# Altium footprint library TranDangKhoa-LIB.PcbLib: 1435 footprints (part 20 of 90)
Each footprint in its own frame and in the unit in brackets; x right, y up, seen from the top. Pads: shape width x height; smd on the part's side, far side on the other; paste and mask are expansions set on the pad; w line width, h text height; cw(c..) or ccw(c..) is an arc to the next point about the centre after c.
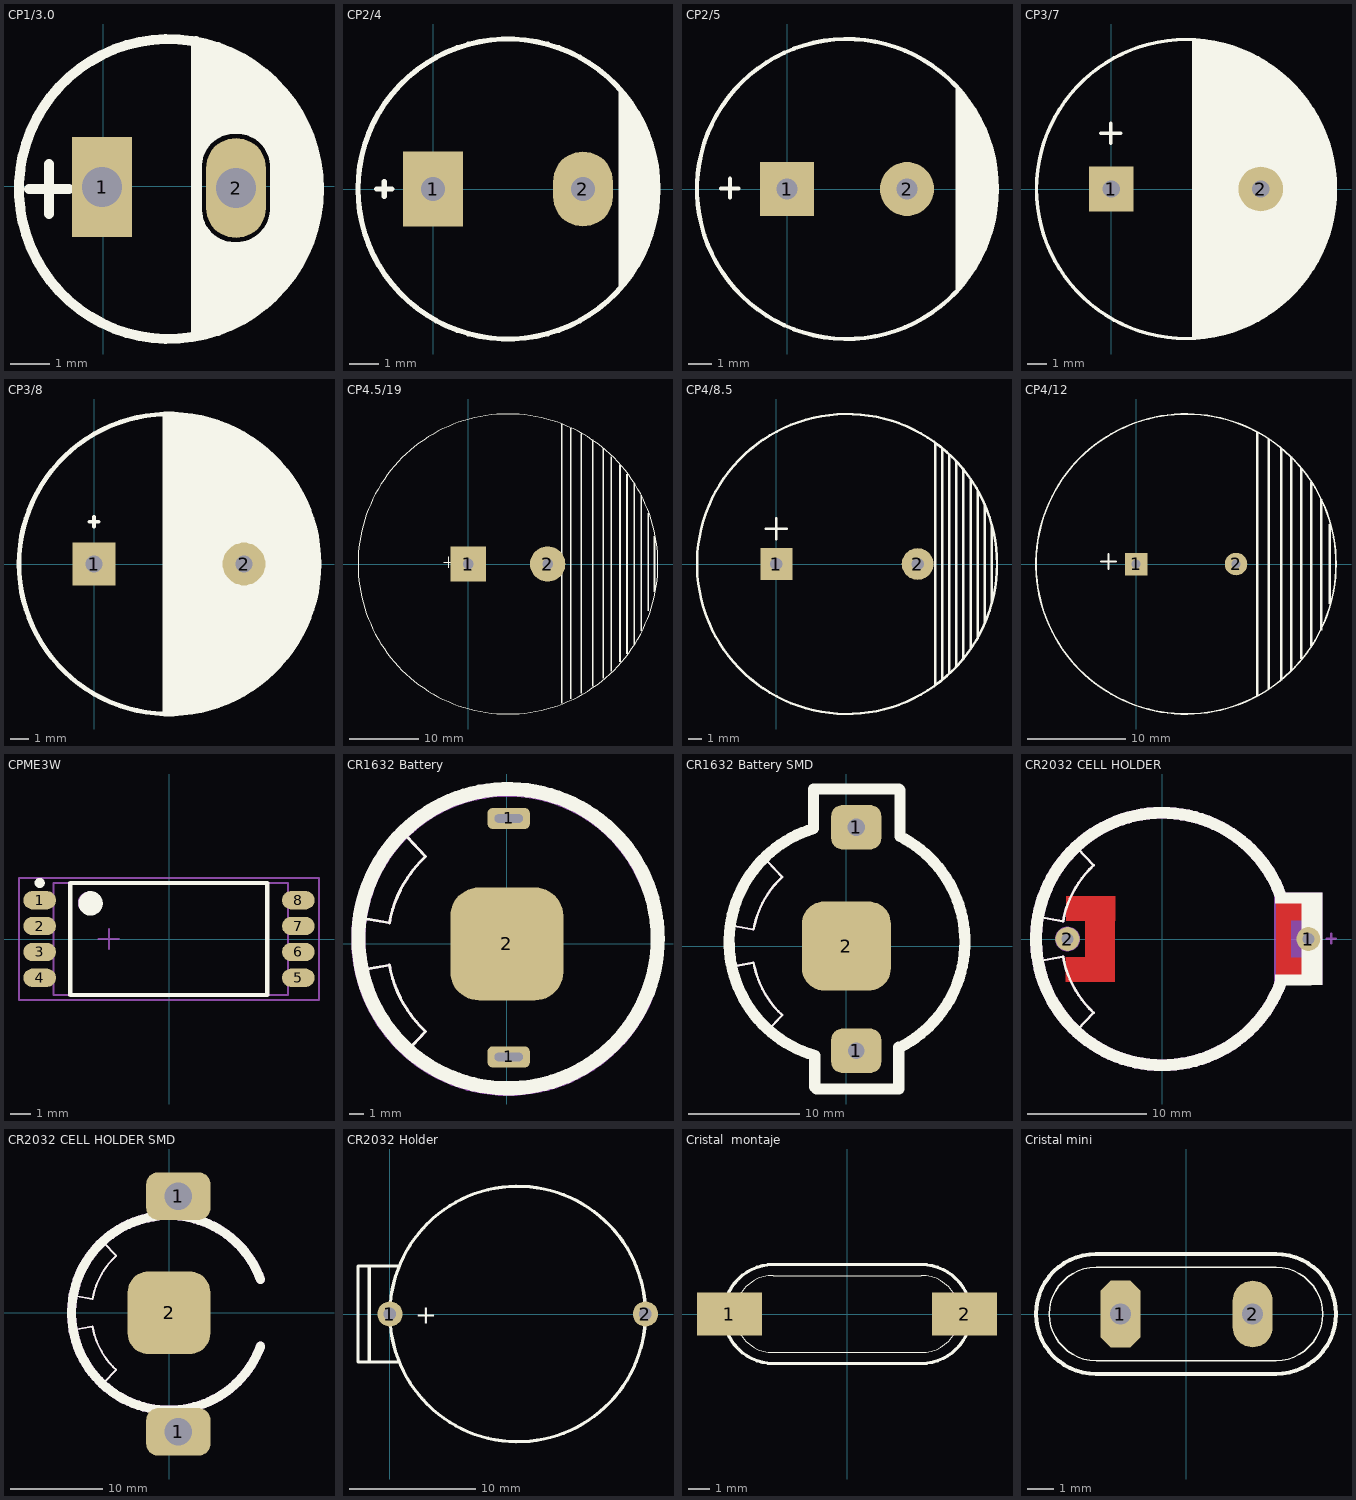
[diagram p19: the footprints below, top view; thin cyan lines are the x and y axes]

## CP1/3.0 [mil]
pads (2):
  rect 60x100 hole 40: 1(-1,-1)
  oval 60x100 hole 40: 2(133,-2)
Top Overlay:
  circle w10: c66,-3 r150
  region: 93,146 93,37 121,58 143,58 165,42 174,-3 166,-43 141,-62 106,-53 92,-36 93,-150 152,-128 208,-60 216,16 185,93 139,129
  lines w10: -74,-3 -34,-3 ; -54,-28 -54,22 ; 93,-147 93,145 ; 94,-27 94,22 cw(c131.5,19.5) 131.01,57.08 ; 94,-25 ccw(c131.5,-23.5) 133,-61 ccw(c133.5,-22.5) 172,-23 ; 131,57 cw(c134,19) 172,22 ; 172,-30 172,25
3D body "User Library-CAP 8X11_5.STEP": height 452.87, standoff -747.43, extent -90,-162.48 224.96,152.48

## CP2/4 [mil] "Tu hoa 1000uF/16V/25V"
height 400
pads (2):
  rect 80x100 hole 32: 1(0,0)
  oval 80x100 hole 32: 2(200,0)
Top Overlay:
  circle w7: c100,0 r200
  region: 248,133 248,-134 262,-117 274,-97 284,-81 293,-55 299,-21 298,21 296,46 281,85 258,122
  lines w7: -75,0 -55,0 ; -65,-10 -65,10

## CP2/5 [mil] "Tu hoa 1000uF/25V,50V"
height 600
pads (2):
  rect 90x90 hole 35: 1(0,0)
  round 90 hole 35: 2(200,0)
Top Overlay:
  circle w7: c100,0 r250
  region: 281,174 281,-175 300,-149 301,-151 318,-124 334,-90 349,-29 350,0 348,34 341,70 321,116
  lines w7: -110,1 -81,1 ; -95,-14 -95,17
3D body "User Library-Cap12_5x25.STEP": height 649.61, standoff -1082.19, extent -146.64,-246.05 345.48,246.07

## CP3/7 [mil] "Tu hoa 4700uF/25V"
height 600
pads (2):
  rect 90x90 hole 35: 1(0,0)
  round 90 hole 35: 2(300,0)
Top Overlay:
  circle w7: c150,0 r300
  region: 425,112 433,96 442,79 447,39 450,-9 449,-34 442,-69 429,-115 397,-171 382,-191 371,-203 327,-244 276,-273 219,-294 163,-301 163,301 192,299 223,293 283,268 333,235 363,213 384.5,182.5 395,168 408,153
  lines w7: -21,112 19,112 ; -1,92 -1,132
3D body "User Library-CE_R300_D650_H1000.STEP": height 1050, standoff -87.8, extent -174.13,-324.03 474.8,324.04

## CP3/8 [mil]
pads (2):
  rect 90x90 hole 35: 1(0,0)
  round 90 hole 35: 2(314.96,0)
Top Overlay:
  circle w10: c157.48,0 r314.96
  region: 147.64,314.96 226.38,305.12 314.96,275.59 364.17,236.22 413.39,187.01 452.76,118.11 462.6,68.9 472.44,29.53 472.44,-49.21 452.76,-118.11 423.23,-167.32 393.7,-206.69 344.49,-255.91 285.43,-285.43 226.38,-305.12 187.01,-314.96 147.64,-314.96
  lines w7.87: -9.84,88.58 9.84,88.58 ; 0,78.74 0,98.43 ; 147.64,-314.96 147.64,314.96
3D body "User Library-CE_R300_D650_H1000.STEP": height 1039.37, standoff -98.43, extent -166.65,-324.03 482.28,324.04

## CP4.5/19 [mil] "Tu hoa 10,000uF/63V"
height 600
pads (2):
  rect 200x200 hole 60: 1(0,0)
  round 200 hole 60: 2(450,0)
Top Overlay:
  circle w7: c225,0 r850
  rectangle: 525,-790 535,795
  rectangle: 575,-765 585,770
  rectangle: 635,-735 645,740
  rectangle: 700,-695 710,705
  rectangle: 1050,-160 1060,160
  rectangle: 1015,-265 1025,290
  rectangle: 760,-650 770,655
  rectangle: 805,-610 815,610
  rectangle: 855,-555 865,560
  rectangle: 895,-510 905,510
  rectangle: 935,-455 945,455
  rectangle: 975,-380 985,390
  lines w7: -140,10 -80,10 ; -110,-20 -110,40

## CP4/8.5 [mil] "Tu hoa 4700uF/50V"
height 600
pads (2):
  rect 90x90 hole 35: 1(0,0)
  round 90 hole 35: 2(400,0)
Top Overlay:
  circle w7: c200,0 r425
  lines w7: -30,100 30,100 ; 0,70 0,130 ; 450,-340 450,340 ; 470,-325 470,325 ; 490,-310 490,310 ; 510,-290 510,290 ; 530,-265 530,265 ; 550,-240 550,240 ; 570,-210 570,205 ; 590,-165 590,170
  lines w8: 610,-110 610,110
3D body "User Library-ECEC2DP271BJ.STEP": height 984.25, standoff 0, extent -236.14,-438.07 630,428.07

## CP4/12 [mil] "Tu hoa 220uF/450V"
height 600
pads (2):
  rect 90x90 hole 35: 1(0,0)
  round 90 hole 35: 2(400,0)
Top Overlay:
  circle w7: c200,0 r600
  rectangle: 695,-330 705,330
  rectangle: 655,-380 665,385
  rectangle: 615,-425 625,430
  rectangle: 575,-465 585,465
  rectangle: 525,-500 535,500
  rectangle: 480,-530 490,530
  rectangle: 735,-265 745,260
  rectangle: 770,-160 780,160
  lines w7: -140,10 -80,10 ; -110,-20 -110,40

## CPME3W [mm] "SOP, 8-Leads, Body 5.3x5.3mm, Pitch 1.27mm, IPC Medium Density"
height 1.5
pads (8):
  oval 1.6x0.9 smd: 1(-6.35,1.905) 2(-6.35,0.635) 3(-6.35,-0.635) 4(-6.35,-1.905) 5(6.35,-1.905) 6(6.35,-0.635) 7(6.35,0.635) 8(6.35,1.905)
Top Overlay:
  circle w0.6: c-3.85,1.75 r0.3
  circle w0.25: c-6.35,2.755 r0.125
  lines w0.2: -4.85,-2.75 4.826,-2.75 4.826,2.75 -4.85,2.75 -4.85,-2.75
Mechanical 13:
  circle w0.1: c-3.929,1.778 r0.5
  lines w0.1: -5.675,-2.75 5.842,-2.75 5.842,2.75 -5.675,2.75 -5.675,-2.75
Mechanical 15:
  lines w0.1: -3.45,0 -2.45,0 ; -2.95,-0.5 -2.95,0.5 ; -7.366,-3 7.366,-3 7.366,3 -7.366,3 -7.366,-3

## CR1632 Battery [mm]
pads (3):
  rrect50% 3x1.5 hole 0.6 slot 2 at 0 deg: 1(0.127,-8.001) 1(0.127,8.89)
  rrect50% 8x8 smd: 2(0,0)
Top Overlay:
  lines w0.2: -10.325,-1.85 -8.35,-1.5 ; -10.325,1.85 -8.35,1.5 ; -8.325,-1.496 ccw(c0,0) -5.759,-6.195 -7.1,-7.625 ; -8.325,1.496 cw(c0,0) -5.759,6.195 -7.1,7.625
  lines w1: 10.668,-0.133 cw(c0.08,0.377) 10.668,-0.127
Mechanical 7:
  lines w0.2: -10.325,-1.85 -8.35,-1.5 ; -10.325,1.85 -8.35,1.5 ; -8.325,-1.496 ccw(c0,0) -5.759,-6.195 -7.1,-7.625 ; -8.325,1.496 cw(c0,0) -5.759,6.195 -7.1,7.625
  lines w1: 10.022,3.989 ccw(c0.074,0.328) 10.033,-3.302
3D body "keystone 3012-30.step": height 5, standoff -1.73, extent -7.417,-8.509 7.925,9.434
3D body "cr-1632 batt.step": height -0.41, standoff -3.61, extent -8,-7.619 8,8.381

## CR1632 Battery SMD [mm]
pads (3):
  rrect50% 4.5x4 hole 1.5: 1(0.889,-9.398)
  rrect50% 4.5x4 hole 1.6: 1(0.889,10.668)
  rrect50% 8x8 smd: 2(0,0)
Top Overlay:
  lines w0.2: -10.325,-1.85 -8.35,-1.5 ; -10.325,1.85 -8.35,1.5 ; -8.325,-1.496 ccw(c0,0) -5.759,-6.195 -7.1,-7.625 ; -8.325,1.496 cw(c0,0) -5.759,6.195 -7.1,7.625
  lines w0.254: -2.935,14.083 -2.921,14.097 ; -2.84,-12.654 -2.667,-12.827 ; 4.699,14.097 4.799,13.997
  lines w1: -2.935,14.083 -2.935,10.54 ccw(c0.08,0.377) -2.84,-9.813 -2.84,-12.654 ; -2.921,14.097 4.699,14.097 ; -2.667,-12.827 4.699,-12.827 4.699,-9.086 ; 4.797,-9.086 ccw(c0.033,0.383) 4.799,9.851 4.799,13.997
Mechanical 7:
  lines w0.2: -10.325,-1.85 -8.35,-1.5 ; -10.325,1.85 -8.35,1.5 ; -8.325,-1.496 ccw(c0,0) -5.759,-6.195 -7.1,-7.625 ; -8.325,1.496 cw(c0,0) -5.759,6.195 -7.1,7.625
3D body "cr-1632 batt.step": height -0.41, standoff -3.61, extent -7.874,-7.492 8.126,8.508
3D body "keystone 3012-301.step": height 3.97, standoff 0.01, extent -6.579,-10.973 8.763,12.243

## CR2032 CELL HOLDER [mm]
pads (2):
  round 2 hole 1: 1(12.275,0) 2(-7.95,0)
Top Layer:
  rectangle: -6.475,-3.6 -3.95,3.6
  region: -3.941,1.527 -3.941,3.602 -8.09,3.602 -8.09,1.527
  region: -8.109,-1.527 -8.109,-3.602 -3.959,-3.602 -3.959,-1.527
  region: 12.298,1.534 12.298,3.609 9.573,3.609 9.573,1.534
  region: 9.577,-1.534 9.577,-3.609 12.302,-3.609 12.302,-1.534
  region: 10.802,3.591 9.577,3.591 9.577,-3.609 10.802,-3.609
Top Overlay:
  rectangle: 11.716,-3.877 13.466,3.898
  region: 9.466,3.873 9.466,2.998 12.591,2.998 12.591,3.873
  region: 12.59,-3.877 12.59,-3.002 9.466,-3.002 9.466,-3.877
  lines w0.2: -10.325,-1.85 -8.35,-1.5 ; -10.325,1.85 -8.35,1.5 ; -8.325,-1.496 ccw(c0,0) -5.759,-6.195 -7.1,-7.625 ; -8.325,1.496 cw(c0,0) -5.759,6.195 -7.1,7.625 ; 10.4,-3.8 12.5,-3.8 ; 10.425,3.8 12.5,3.8
  lines w1: 9.948,3.661 ccw(c0,0) 9.959,-3.63
Mechanical 7:
  circle w0.4: c-7.95,0 r0.848
  rectangle: 9.398,-3.875 13.475,3.9
  lines w0.2: -10.325,-1.85 -8.35,-1.5 ; -10.325,1.85 -8.35,1.5 ; -8.325,-1.496 ccw(c0,0) -5.759,-6.195 -7.1,-7.625 ; -8.325,1.496 cw(c0,0) -5.759,6.195 -7.1,7.625 ; 13.796,0.026 14.396,0.026 14.596,0.026 ; 14.196,-0.374 14.196,0.426
  lines w1: 9.948,3.661 ccw(c0,0) 9.959,-3.63
3D body: height 0.8, standoff 0.1, extent -8.429,-1.202 -0.041,0.999
3D body: height 0.2, standoff -2.3, extent -8.357,-0.418 -7.518,0.395
3D body: height 0.2, standoff -2.3, extent 11.887,-0.381 12.624,0.381
3D body: height 0.18, standoff 0, extent 10.984,-0.459 12.876,0.49
3D body: height 0.5, standoff 0, extent -10.565,-0.628 10.654,10.59
3D body: height 9, standoff 1, extent 9.725,-3.062 11.187,3.239
3D body: height 10, standoff 0, extent 12.652,-3.687 13.171,3.441
3D body: height 9.9, standoff 0, extent 9.646,-3.974 13.165,3.915
3D body: height 6, standoff 0, extent -10.617,-10.589 10.582,10.629
3D body: height 0.5, standoff 0, extent -10.561,-10.522 10.658,0.696
3D body "CR 2032 Lithium Cell.step": height 5, standoff 1.8, extent -9.873,-10.127 10.127,9.873

## CR2032 CELL HOLDER SMD [mm]
pads (3):
  rrect50% 7x5.2 hole 3: 1(1.016,-12.954) 1(1.016,12.7)
  rrect50% 9x9 smd: 2(0,0)
Top Overlay:
  lines w0.2: -10.325,-1.85 -8.35,-1.5 ; -10.325,1.85 -8.35,1.5 ; -8.325,-1.496 ccw(c0,0) -5.759,-6.195 -7.1,-7.625 ; -8.325,1.496 cw(c0,0) -5.759,6.195 -7.1,7.625
  lines w1: 9.948,3.661 ccw(c0,0) 9.959,-3.63
Mechanical 7:
  lines w0.2: -10.325,-1.85 -8.35,-1.5 ; -10.325,1.85 -8.35,1.5 ; -8.325,-1.496 ccw(c0,0) -5.759,-6.195 -7.1,-7.625 ; -8.325,1.496 cw(c0,0) -5.759,6.195 -7.1,7.625
  lines w1: 9.948,3.661 ccw(c0,0) 9.959,-3.63
3D body "CR 2032 Lithium Cell.step": height 3.2, standoff 0, extent -9.873,-10.127 10.127,9.873
3D body "3002.step": height 3.97, standoff 0.01, extent -8.757,-15.494 11.297,15.24

## CR2032 Holder [mm]
pads (2):
  round 2 hole 1: 1(0,0) 2(20.32,0)
Top Overlay:
  circle w0.254: c10.16,0 r10.161
  lines w0.254: -1.651,-3.81 -1.651,3.81 ; 0.635,-3.81 -2.54,-3.81 -2.54,3.81 0.635,3.81
  text "+" at 2.032,-0.762 h1.52

## Cristal  montaje [mm] "Cristal de cuarzo de montaje superficial"
pads (2):
  rect 3x2 smd: 1(-5.45,0) 2(5.425,0)
Top Overlay:
  lines w0.051: -3.429,-1.778 cw(c-3.429,0) -3.429,1.778 3.429,1.778 cw(c3.429,0) 3.429,-1.778 -3.429,-1.778
  lines w0.152: -3.429,-2.286 cw(c-3.429,0) -3.429,2.286 3.429,2.286 cw(c3.429,0) 3.429,-2.286 -3.429,-2.286
3D body "CRISTAL DE MONTAJEhcm49.STEP": height 4.24, standoff 0, extent -6.075,-2.375 6.325,2.455

## Cristal mini [mm] "Cristal de cuarzo empaque pequeño"
pads (2):
  oct 1.524x2.54 hole 0.8: 1(-2.5,0)
  oval 1.524x2.54 hole 0.8: 2(2.54,0)
Top Overlay:
  lines w0.051: -3.429,-1.778 cw(c-3.429,0) -3.429,1.778 3.429,1.778 cw(c3.429,0) 3.429,-1.778 -3.429,-1.778
  lines w0.152: -3.429,-2.286 cw(c-3.429,0) -3.429,2.286 3.429,2.286 cw(c3.429,0) 3.429,-2.286 -3.429,-2.286
3D body "SW3dPS-HP49US.STEP": height 3.5, standoff -4, extent -5.625,-2.35 5.725,2.3